# Altium footprint library YS_PCBLIB.PcbLib: 133 footprints (part 8 of 9)
Each footprint in its own frame and in the unit in brackets; x right, y up, seen from the top. Pads: shape width x height; smd on the part's side, far side on the other; paste and mask are expansions set on the pad; w line width, h text height; cw(c..) or ccw(c..) is an arc to the next point about the centre after c.
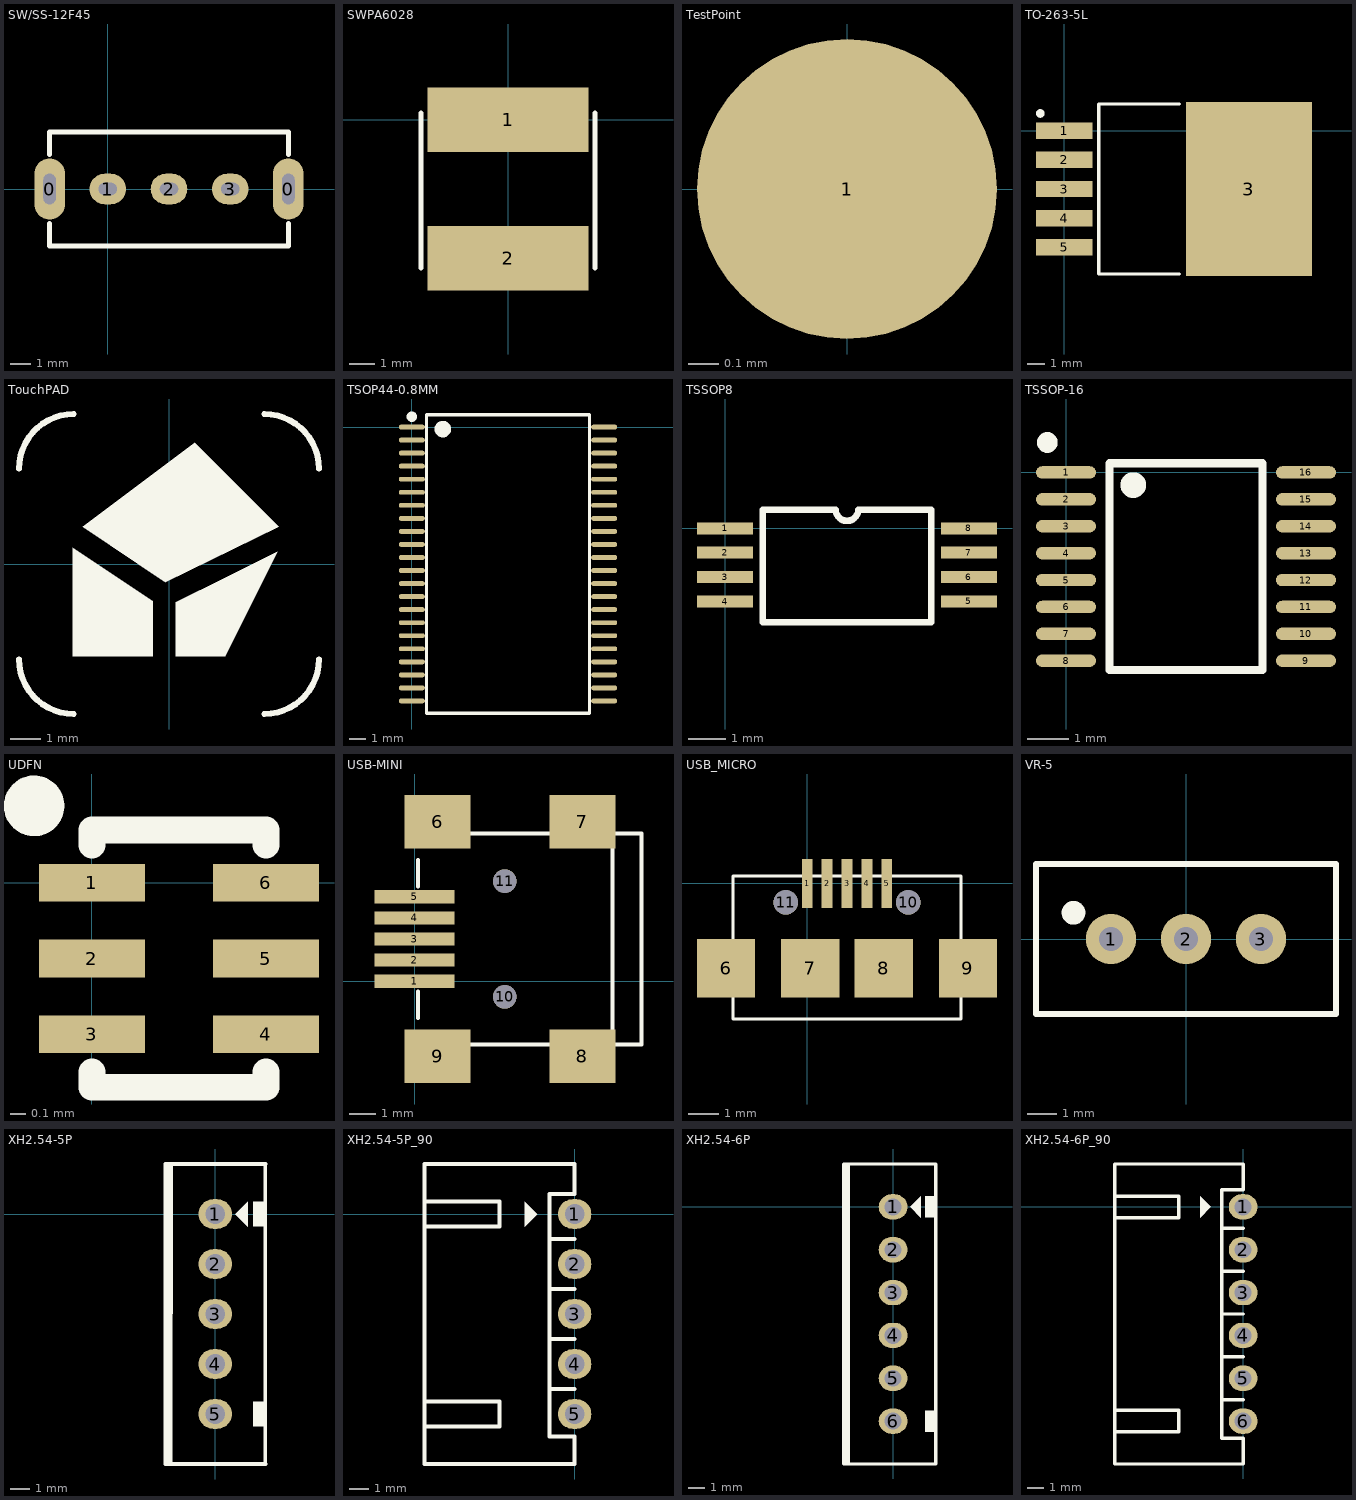
[diagram p7: the footprints below, top view; thin cyan lines are the x and y axes]

## SW/SS-12F45 [mm]
pads (5):
  oval 1.5x3 hole 0.6 slot 1.5 at 90 deg: 0(-2.85,0) 0(8.85,0)
  oval 1.8x1.5 hole 0.6 slot 0.9 at 0 deg: 1(0,0) 2(3,0) 3(6,0)
Top Overlay:
  lines w0.254: -2.85,-1.7 -2.85,-2.8 8.85,-2.8 8.85,-1.7 ; -2.85,1.7 -2.85,2.8 8.85,2.8 8.85,1.7

## SWPA6028 [mil]
pads (2):
  rect 250x100 smd: 1(0,0) 2(0,-215)
Top Overlay:
  lines w7.99: -135,-230 -135,10 ; 135,-230 135,10

## TestPoint [mm]
pads (1):
  round 1 smd: 1(0,0)

## TO-263-5L [mm]
pads (6):
  rect 3.3x0.95 smd: 1(0,0) 2(0,-1.7) 3(0,-3.4) 4(0,-5.1) 5(0,-6.8)
  rect 7.35x10.15 smd: 3(10.75,-3.4)
Top Overlay:
  circle w0.25: c-1.4,1 r0.125
  lines w0.2: 6.7,-8.35 2,-8.35 2,1.55 6.7,1.55

## TouchPAD [mm]
pads (1):
  rrect50% 0.1x0.1 on Top Overlay: 1(0,0)
Top Overlay:
  region: -1.93,1.245 0.864,4.039 3.658,1.245
  region: 0.864,4.039 -1.93,1.245 -2.87,1.245
  region: -2.87,1.245 -1.981,1.245 -0.127,-0.61
  region: -0.127,-0.61 -1.981,1.245 3.658,1.245
  region: -0.533,-1.245 -3.2,-1.245 -3.2,0.533
  region: -3.2,-1.245 -3.2,-3.073 -0.533,-3.073 -0.533,-1.245
  region: 0.229,-1.27 0.229,-3.073 1.88,-3.073 1.88,-0.457
  region: 2.743,-0.457 1.88,-0.457 1.88,-3.073
  region: 1.88,-3.073 1.88,-1.321 3.607,0.406
  region: 1.88,-0.457 2.743,-0.457 3.607,0.406
  lines w0.2: -5,-3.175 ccw(c-3.175,-3.175) -3.175,-5 ; -5,3.175 cw(c-3.175,3.175) -3.175,5 ; 3.175,-5 ccw(c3.175,-3.175) 5,-3.175 ; 3.175,5 cw(c3.175,3.175) 5,3.175

## TSOP44-0.8MM [mm]
pads (44):
  oval 1.6x0.3 smd: 1(0,0) 2(0,-0.8) 3(0,-1.6) 4(0,-2.4) 5(0,-3.2) 6(0,-4) 7(0,-4.8) 8(0,-5.6) 9(0,-6.4) 10(0,-7.2) 11(0,-8) 12(0,-8.8) 13(0,-9.6) 14(0,-10.4) 15(0,-11.2) 16(0,-12) 17(0,-12.8) 18(0,-13.6) 19(0,-14.4) 20(0,-15.2) 21(0,-16) 22(0,-16.8) 23(11.8,-16.8) 24(11.8,-16) 25(11.8,-15.2) 26(11.8,-14.4) 27(11.8,-13.6) 28(11.8,-12.8) 29(11.8,-12) 30(11.8,-11.2) 31(11.8,-10.4) 32(11.8,-9.6) 33(11.8,-8.8) 34(11.8,-8) 35(11.8,-7.2) 36(11.8,-6.4) 37(11.8,-5.6) 38(11.8,-4.8) 39(11.8,-4) 40(11.8,-3.2) 41(11.8,-2.4) 42(11.8,-1.6) 43(11.8,-0.8) 44(11.8,0)
Top Overlay:
  circle w0.508: c1.905,-0.127 r0.254
  circle w0.381: c0,0.635 r0.127
  lines w0.2: 0.9,-17.55 0.9,0.75 10.9,0.75 10.9,-17.55 0.9,-17.55

## TSSOP8 [mm]
pads (8):
  rect 1.5x0.32 smd: 1(0,0) 2(0,-0.65) 3(0,-1.3) 4(0,-1.95) 5(6.5,-1.95) 6(6.5,-1.3) 7(6.5,-0.65) 8(6.5,0)
Top Overlay:
  lines w0.178: 1,0.5 1,-2.5 5.5,-2.5 5.5,0.5 3.55,0.5 cw(c3.25,0.5) 2.95,0.5 1.05,0.5

## TSSOP-16 [mm]
pads (16):
  oval 1.45x0.3 smd: 1(0,0) 2(0,-0.65) 3(0,-1.3) 4(0,-1.95) 5(0,-2.6) 6(0,-3.25) 7(0,-3.9) 8(0,-4.55) 9(5.8,-4.55) 10(5.8,-3.9) 11(5.8,-3.25) 12(5.8,-2.6) 13(5.8,-1.95) 14(5.8,-1.3) 15(5.8,-0.65) 16(5.8,0)
Top Overlay:
  circle w0.25: c-0.45,0.725 r0.125
  circle w0.5: c1.626,-0.305 r0.06
  lines w0.2: 1.05,-4.775 1.05,0.225 4.75,0.225 4.75,-4.775 1.05,-4.775

## UDFN [mm]
pads (6):
  rect 0.7x0.25 smd: 1(0,0) 2(0,-0.5) 3(0,-1) 4(1.15,-1) 5(1.15,-0.5) 6(1.15,0)
Top Overlay:
  circle w0.2: c-0.381,0.508 r0.1
  lines w0.178: 0,-1.25 0,-1.35 1.15,-1.35 1.15,-1.25 ; 0,0.25 0,0.35 1.15,0.35 1.15,0.25

## USB-MINI [mm]
pads (11):
  rect 3.048x0.508 smd: 1(0,0) 2(0,0.8) 3(0,1.6) 4(0,2.4) 5(0,3.2)
  rect 2.5x2.032 smd: 6(0.879,6.05) 7(6.379,6.05) 8(6.379,-2.85) 9(0.879,-2.85)
  round 0.9 hole 0.9 unplated: 10(3.429,-0.6) 11(3.429,3.8)
Top Overlay:
  lines w0.152: 0.129,-1.4 0.129,-0.4 ; 0.129,3.6 0.129,4.6 ; 1.929,-2.4 5.329,-2.4 ; 1.929,5.6 5.329,5.6 ; 7.429,-2.4 8.629,-2.4 8.629,5.6 7.429,5.6 ; 7.529,-2.4 7.529,5.6

## USB_MICRO [mm]
pads (11):
  rect 0.35x1.6 smd: 1(0,0) 2(0.65,0) 3(1.3,0) 4(1.95,0) 5(2.6,0)
  rrect0% 1.9x1.9 smd: 6(-2.65,-2.775) 7(0.1,-2.775) 8(2.5,-2.775) 9(5.25,-2.775)
  round 0.8 hole 0.8: 10(3.3,-0.625) 11(-0.7,-0.625)
Top Overlay:
  lines w0.1: -2.43,-4.437 5.03,-4.437 5.03,0.235 -2.43,0.235 -2.43,-4.437

## VR-5 [mm]
height 4.6
pads (3):
  round 1.7 hole 0.8: 1(-2.54,0) 2(0,0) 3(2.54,0)
Top Overlay:
  lines w0.2: -5.08,-2.54 5.08,-2.54 5.08,2.54 -5.08,2.54 -5.08,-2.54
  lines w0.4: -3.621,0.82 cw(c-3.81,0.889) -3.609,0.882

## XH2.54-5P [mm]
pads (5):
  oval 1.7x1.5 hole 1: 1(0,0) 2(0,-2.54) 3(0,-5.08) 4(0,-7.62) 5(0,-10.16)
Top Overlay:
  region: -2.54,2.54 -2.54,-12.7 -2.159,-12.7 -2.159,2.54
  region: 1.905,-9.525 1.905,-10.795 2.54,-10.795 2.54,-9.525
  region: 1.905,0.635 1.905,-0.635 2.54,-0.635 2.54,0.635
  region: 1.016,0 1.651,0.635 1.651,-0.635
  lines w0.2: -2.54,-12.7 -2.54,2.54 ; 2.54,-12.7 2.54,2.54
  lines w0.203: -2.54,-12.7 2.54,-12.7 ; -2.54,2.54 2.54,2.54

## XH2.54-5P_90 [mm]
pads (5):
  oval 1.7x1.5 hole 1: 1(0,0) 2(0,-2.54) 3(0,-5.08) 4(0,-7.62) 5(0,-10.16)
Top Overlay:
  region: -2.54,0.635 -1.905,0 -2.54,-0.635
  lines w0.203: -7.62,-0.889 -7.62,0.889 ; -1.27,-8.89 0,-8.89 ; -1.27,-6.35 0,-6.35 ; -1.27,-3.81 0,-3.81 ; 0,-1.27 -1.27,-1.27 -1.27,0.635 -1.27,1.016 ; -7.62,-10.795 -7.62,-9.525 ; -7.62,-10.795 -3.81,-10.795 -3.81,-9.525 -7.62,-9.525 ; -7.62,-10.795 -7.62,-12.7 -1.27,-12.7 0,-12.7 0,-11.303 -1.27,-11.303 -1.27,1.016 ; -7.62,-9.525 -7.62,-0.635 -3.81,-0.635 -3.81,0.635 -7.62,0.635 -7.62,2.54 0,2.54 0,1.016 -1.27,1.016

## XH2.54-6P [mm]
pads (6):
  oval 1.7x1.5 hole 1: 1(0,0) 2(0,-2.54) 3(0,-5.08) 4(0,-7.62) 5(0,-10.16) 6(0,-12.7)
Top Overlay:
  region: -2.921,2.54 -2.921,-15.24 -2.54,-15.24 -2.54,2.54
  region: 1.905,-12.065 1.905,-13.335 2.54,-13.335 2.54,-12.065
  region: 1.905,0.635 1.905,-0.635 2.54,-0.635 2.54,0.635
  region: 1.016,0 1.651,0.635 1.651,-0.635
  lines w0.2: -2.921,2.54 -2.921,-15.24 2.54,-15.24 2.54,2.54
  lines w0.203: -2.921,2.54 2.54,2.54

## XH2.54-6P_90 [mm]
pads (6):
  oval 1.7x1.5 hole 1: 1(0,0) 2(0,-2.54) 3(0,-5.08) 4(0,-7.62) 5(0,-10.16) 6(0,-12.7)
Top Overlay:
  region: -2.54,0.635 -1.905,0 -2.54,-0.635
  lines w0.203: -7.62,-0.889 -7.62,0.889 ; -1.27,-11.43 0,-11.43 ; -1.27,-8.89 0,-8.89 ; -1.27,-6.35 0,-6.35 ; -1.27,-3.81 0,-3.81 ; 0,-1.27 -1.27,-1.27 -1.27,0.635 -1.27,1.016 ; -1.27,1.016 0,1.016 0,2.54 -7.62,2.54 -7.62,0.635 -3.81,0.635 -3.81,-0.635 -7.62,-0.635 -7.62,-10.795 -7.62,-15.24 -1.27,-15.24 0,-15.24 0,-13.716 -1.27,-13.716 -1.27,1.016 ; -7.62,-13.335 -3.81,-13.335 -3.81,-12.065 -7.62,-12.065 -7.62,-13.335